# Altium footprint library Connectors.PcbLib: 66 footprints (part 4 of 5)
Each footprint in its own frame and in the unit in brackets; x right, y up, seen from the top. Pads: shape width x height; smd on the part's side, far side on the other; paste and mask are expansions set on the pad; w line width, h text height; cw(c..) or ccw(c..) is an arc to the next point about the centre after c.
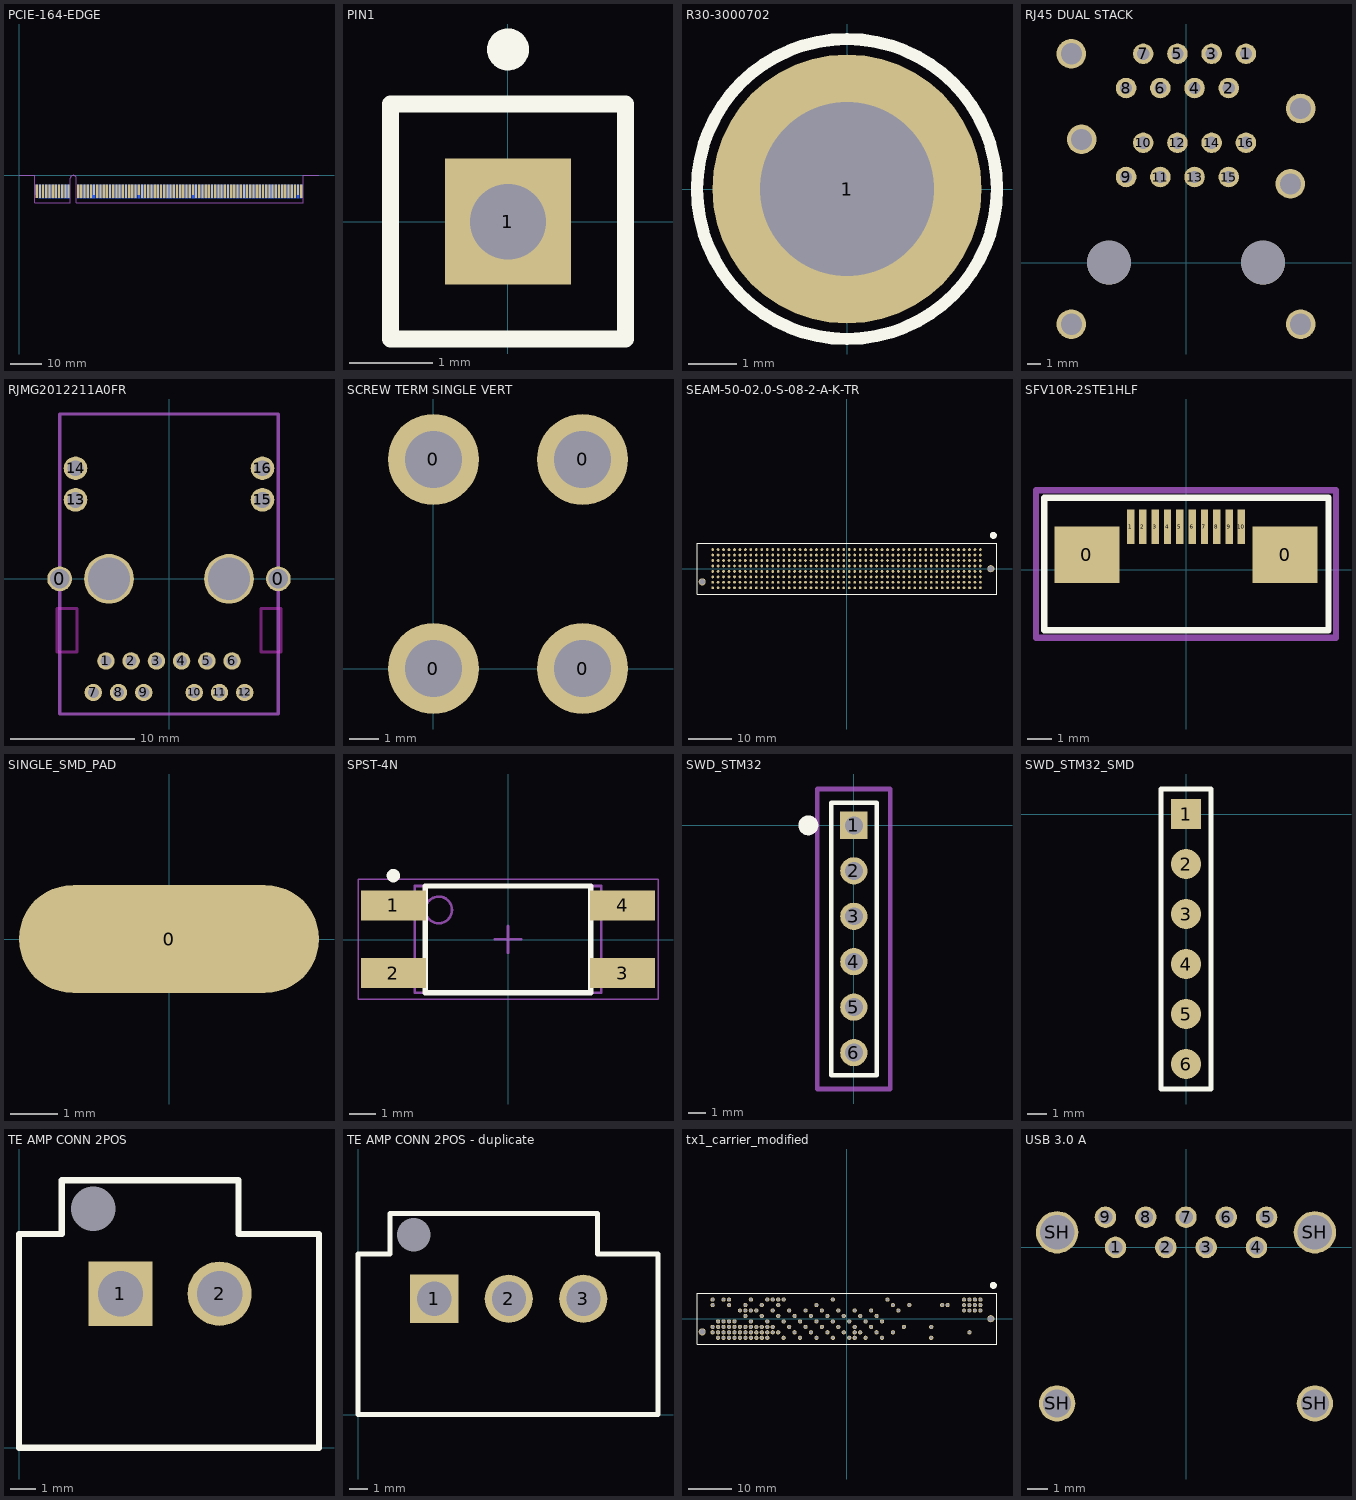
[diagram p3: the footprints below, top view; thin cyan lines are the x and y axes]

## PCIE-164-EDGE [mm] "PCIe x16 Edge Connector Pads, 164 position"
pads (164):
  rect 0.7x3.2 smd far side mask+0.102: 1(5.55,-4.5)
  rect 0.7x4.2 smd far side: 2(6.55,-5) 3(7.55,-5) 4(8.55,-5) 5(9.55,-5) 6(10.55,-5) 7(11.55,-5) 8(12.55,-5) 9(13.55,-5) 10(14.55,-5) 11(15.55,-5) 12(18.55,-5) 13(19.55,-5) 14(20.55,-5) 15(21.55,-5) 16(22.55,-5) 17(23.55,-5) 18(24.55,-5) 19(25.55,-5) 20(26.55,-5) 21(27.55,-5) 22(28.55,-5) 23(29.55,-5) 24(30.55,-5) 25(31.55,-5) 26(32.55,-5) 27(33.55,-5) 28(34.55,-5) 29(35.55,-5) 30(36.55,-5) 31(37.55,-5) 32(38.55,-5) 33(39.55,-5) 34(40.55,-5) 35(41.55,-5) 36(42.55,-5) 37(43.55,-5) 38(44.55,-5) 39(45.55,-5) 40(46.55,-5) 41(47.55,-5) 42(48.55,-5) 43(49.55,-5) 44(50.55,-5) 45(51.55,-5) 46(52.55,-5) 47(53.55,-5) 48(54.55,-5) 49(55.55,-5) 50(56.55,-5) 51(57.55,-5) 52(58.55,-5) 53(59.55,-5) 54(60.55,-5) 55(61.55,-5) 56(62.55,-5) 57(63.55,-5) 58(64.55,-5) 59(65.55,-5) 60(66.55,-5) 61(67.55,-5) 62(68.55,-5) 63(69.55,-5) 64(70.55,-5) 65(71.55,-5) 66(72.55,-5) 67(73.55,-5) 68(74.55,-5) 69(75.55,-5) 70(76.55,-5) 71(77.55,-5) 72(78.55,-5) 73(79.55,-5) 74(80.55,-5) 75(81.55,-5) 76(82.55,-5) 77(83.55,-5) 78(84.55,-5) 79(85.55,-5) 80(86.55,-5) 81(87.55,-5) 82(88.55,-5)
  rect 0.7x4.2 smd: 83(5.55,-5) 84(6.55,-5) 85(7.55,-5) 86(8.55,-5) 87(9.55,-5) 88(10.55,-5) 89(11.55,-5) 90(12.55,-5) 91(13.55,-5) 92(14.55,-5) 93(15.55,-5) 94(18.55,-5) 95(19.55,-5) 96(20.55,-5) 97(21.55,-5) 98(22.55,-5) 100(24.55,-5) 101(25.55,-5) 102(26.55,-5) 103(27.55,-5) 104(28.55,-5) 105(29.55,-5) 106(30.55,-5) 107(31.55,-5) 108(32.55,-5) 109(33.55,-5) 110(34.55,-5) 111(35.55,-5) 112(36.55,-5) 114(38.55,-5) 115(39.55,-5) 116(40.55,-5) 117(41.55,-5) 118(42.55,-5) 119(43.55,-5) 120(44.55,-5) 121(45.55,-5) 122(46.55,-5) 123(47.55,-5) 124(48.55,-5) 125(49.55,-5) 126(50.55,-5) 127(51.55,-5) 128(52.55,-5) 129(53.55,-5) 131(55.55,-5) 132(56.55,-5) 133(57.55,-5) 134(58.55,-5) 135(59.55,-5) 136(60.55,-5) 137(61.55,-5) 138(62.55,-5) 139(63.55,-5) 140(64.55,-5) 141(65.55,-5) 142(66.55,-5) 143(67.55,-5) 144(68.55,-5) 145(69.55,-5) 146(70.55,-5) 147(71.55,-5) 148(72.55,-5) 149(73.55,-5) 150(74.55,-5) 151(75.55,-5) 152(76.55,-5) 153(77.55,-5) 154(78.55,-5) 155(79.55,-5) 156(80.55,-5) 157(81.55,-5) 158(82.55,-5) 159(83.55,-5) 160(84.55,-5) 161(85.55,-5) 162(86.55,-5) 164(88.55,-5)
  rect 0.7x3.2 smd mask+0.102: 99(23.55,-4.5) 113(37.55,-4.5) 130(54.55,-4.5) 163(87.55,-4.5)
Mechanical 1:
  lines w0.1: 0,0 5,0 5,-8.5 16.1,-8.5 16.1,-0.95 cw(c17.05,-0.95) 18,-0.95 18,-8.5 89.1,-8.5 89.1,0 94.1,0

## PIN1 [mm] "Connector; Plug"
pads (1):
  rect 1.5x1.5 hole 0.9: 1(0,0)
Top Overlay:
  circle w0.25: c0,2.05 r0.125
  lines w0.2: -1.4,-1.4 1.4,-1.4 1.4,1.4 -1.4,1.4 -1.4,-1.4

## R30-3000702 [mil] "HEX STANDOFF M3 BRASS 7MM"
height 275.59
pads (1):
  round 220 hole 141.7: 1(0,0)
Top Overlay:
  circle w10: c0,0 r122.49

## RJ45 DUAL STACK [mm] "RJ45, 8p8c, 2 port, double stacked connector"
height 25.27
pads (24):
  round 1.524 hole 0.9: 1(4.445,15.49) 2(3.175,12.95) 3(1.905,15.49) 4(0.635,12.95) 5(-0.635,15.49) 6(-1.905,12.95) 7(-3.175,15.49) 8(-4.445,12.95) 10(-3.175,8.89) 11(-1.905,6.35) 12(-0.635,8.89) 13(0.635,6.35) 14(1.905,8.89) 15(3.175,6.35) 16(4.445,8.89)
  round 1.524 hole 0.9 mask+0.102: 9(-4.445,6.35)
  round 2.194 hole 1.57 unplated: ""(-8.505,-4.57) ""(-8.505,15.49) ""(-7.745,9.14) ""(7.745,5.84) ""(8.505,-4.57) ""(8.505,11.43)
  round 3.25 hole 3.25 unplated: ""(-5.715,0) ""(5.715,0)
3D body "c-5569381-1-c1-3d.stp": height 25.29, standoff -4.18, extent -9.652,-10.77 9.652,17.678

## RJMG2012211A0FR [mm] "1 Port RJ45 Magjack Connector Board Edge, Through Hole 10/100/1000 Base-T, AutoMDIX"
height 11.3
pads (20):
  round 2 hole 1.57: 0(-8.79,0) 0(8.79,0)
  round 1.4 hole 0.89: 1(-5.075,-6.6) 2(-3.045,-6.6) 3(-1.015,-6.6) 4(1.015,-6.6) 5(3.045,-6.6) 6(5.075,-6.6) 7(-6.09,-9.14) 8(-4.06,-9.14) 9(-2.03,-9.14) 10(2.03,-9.14) 11(4.06,-9.14) 12(6.09,-9.14)
  round 1.894 hole 1.27: 13(-7.52,6.35) 14(-7.52,8.89) 15(7.52,6.35) 16(7.52,8.89)
  round 4 hole 3.4: ""(-4.825,0) ""(4.825,0)
Keep-Out Layer:
  lines w0.254: -9,-5.89 -7.4,-5.89 -7.4,-2.39 -9,-2.39 -9,-5.89 ; 7.4,-5.89 7.4,-2.39 9,-2.39 9,-5.89 7.4,-5.89
Mechanical 15:
  lines w0.254: -8.79,-10.87 -8.79,13.26 8.79,13.26 8.79,-10.87 -8.79,-10.87

## SCREW TERM SINGLE VERT [mil] "Keystone Electronics 7701 - TERM W/ASSEMBLD SCREW VERT PCMNT"
height 243
pads (4):
  round 120 hole 75: 0(0,0) 0(0,276) 0(197,0) 0(197,276)
3D body "keystone-PN7701.step": height 321.92, standoff -192.49, extent -53.39,-13.97 256.61,296.03

## SEAM-50-02.0-S-08-2-A-K-TR [mil] "TX 1 carrier board connector"
height 4.6
pads (402):
  round 25 smd: A1(1225,175) A2(1175,175) A3(1125,175) A4(1075,175) A5(1025,175) A6(975,175) A7(925,175) A8(875,175) A9(825,175) A10(775,175) A11(725,175) A12(675,175) A13(625,175) A14(575,175) A15(525,175) A16(475,175) A17(425,175) A18(375,175) A19(325,175) A20(275,175) A21(225,175) A22(175,175) A23(125,175) A24(75,175) A25(25,175) A26(-25,175) A27(-75,175) A28(-125,175) A29(-175,175) A30(-225,175) A31(-275,175) A32(-325,175) A33(-375,175) A34(-425,175) A35(-475,175) A36(-525,175) A37(-575,175) A38(-625,175) A39(-675,175) A40(-725,175) A41(-775,175) A42(-825,175) A43(-875,175) A44(-925,175) A45(-975,175) A46(-1025,175) A47(-1075,175) A48(-1125,175) A49(-1175,175) A50(-1225,175) B1(1225,125) B2(1175,125) B3(1125,125) B4(1075,125) B5(1025,125) B6(975,125) B7(925,125) B8(875,125) B9(825,125) B10(775,125) B11(725,125) B12(675,125) B13(625,125) B14(575,125) B15(525,125) B16(475,125) B17(425,125) B18(375,125) B19(325,125) B20(275,125) B21(225,125) B22(175,125) B23(125,125) B24(75,125) B25(25,125) B26(-25,125) B27(-75,125) B28(-125,125) B29(-175,125) B30(-225,125) B31(-275,125) B32(-325,125) B33(-375,125) B34(-425,125) B35(-475,125) B36(-525,125) B37(-575,125) B38(-625,125) B39(-675,125) B40(-725,125) B41(-775,125) B42(-825,125) B43(-875,125) B44(-925,125) B45(-975,125) B46(-1025,125) B47(-1075,125) B48(-1125,125) B49(-1175,125) B50(-1225,125) C1(1225,75) C2(1175,75) C3(1125,75) C4(1075,75) C5(1025,75) C6(975,75) C7(925,75) C8(875,75) C9(825,75) C10(775,75) C11(725,75) C12(675,75) C13(625,75) C14(575,75) C15(525,75) C16(475,75) C17(425,75) C18(375,75) C19(325,75) C20(275,75) C21(225,75) C22(175,75) C23(125,75) C24(75,75) C25(25,75) C26(-25,75) C27(-75,75) C28(-125,75) C29(-175,75) C30(-225,75) C31(-275,75) C32(-325,75) C33(-375,75) C34(-425,75) C35(-475,75) C36(-525,75) C37(-575,75) C38(-625,75) C39(-675,75) C40(-725,75) C41(-775,75) C42(-825,75) C43(-875,75) C44(-925,75) C45(-975,75) C46(-1025,75) C47(-1075,75) C48(-1125,75) C49(-1175,75) C50(-1225,75) D1(1225,25) D2(1175,25) D3(1125,25) D4(1075,25) D5(1025,25) D6(975,25) D7(925,25) D8(875,25) D9(825,25) D10(775,25) D11(725,25) D12(675,25) D13(625,25) D14(575,25) D15(525,25) D16(475,25) D17(425,25) D18(375,25) D19(325,25) D20(275,25) D21(225,25) D22(175,25) D23(125,25) D24(75,25) D25(25,25) D26(-25,25) D27(-75,25) D28(-125,25) D29(-175,25) D30(-225,25) D31(-275,25) D32(-325,25) D33(-375,25) D34(-425,25) D35(-475,25) D36(-525,25) D37(-575,25) D38(-625,25) D39(-675,25) D40(-725,25) D41(-775,25) D42(-825,25) D43(-875,25) D44(-925,25) D45(-975,25) D46(-1025,25) D47(-1075,25) D48(-1125,25) D49(-1175,25) D50(-1225,25) E1(1225,-25) E2(1175,-25) E3(1125,-25) E4(1075,-25) E5(1025,-25) E6(975,-25) E7(925,-25) E8(875,-25) E9(825,-25) E10(775,-25) E11(725,-25) E12(675,-25) E13(625,-25) E14(575,-25) E15(525,-25) E16(475,-25) E17(425,-25) E18(375,-25) E19(325,-25) E20(275,-25) E21(225,-25) E22(175,-25) E23(125,-25) E24(75,-25) E25(25,-25) E26(-25,-25) E27(-75,-25) E28(-125,-25) E29(-175,-25) E30(-225,-25) E31(-275,-25) E32(-325,-25) E33(-375,-25) E34(-425,-25) E35(-475,-25) E36(-525,-25) E37(-575,-25) E38(-625,-25) E39(-675,-25) E40(-725,-25) E41(-775,-25) E42(-825,-25) E43(-875,-25) E44(-925,-25) E45(-975,-25) E46(-1025,-25) E47(-1075,-25) E48(-1125,-25) E49(-1175,-25) E50(-1225,-25) F1(1225,-75) F2(1175,-75) F3(1125,-75) F4(1075,-75) F5(1025,-75) F6(975,-75) F7(925,-75) F8(875,-75) F9(825,-75) F10(775,-75) F11(725,-75) F12(675,-75) F13(625,-75) F14(575,-75) F15(525,-75) F16(475,-75) F17(425,-75) F18(375,-75) F19(325,-75) F20(275,-75) F21(225,-75) F22(175,-75) F23(125,-75) F24(75,-75) F25(25,-75) F26(-25,-75) F27(-75,-75) F28(-125,-75) F29(-175,-75) F30(-225,-75) F31(-275,-75) F32(-325,-75) F33(-375,-75) F34(-425,-75) F35(-475,-75) F36(-525,-75) F37(-575,-75) F38(-625,-75) F39(-675,-75) F40(-725,-75) F41(-775,-75) F42(-825,-75) F43(-875,-75) F44(-925,-75) F45(-975,-75) F46(-1025,-75) F47(-1075,-75) F48(-1125,-75) F49(-1175,-75) F50(-1225,-75) G1(1225,-125) G2(1175,-125) G3(1125,-125) G4(1075,-125) G5(1025,-125) G6(975,-125) G7(925,-125) G8(875,-125) G9(825,-125) G10(775,-125) G11(725,-125) G12(675,-125) G13(625,-125) G14(575,-125) G15(525,-125) G16(475,-125) G17(425,-125) G18(375,-125) G19(325,-125) G20(275,-125) G21(225,-125) G22(175,-125) G23(125,-125) G24(75,-125) G25(25,-125) G26(-25,-125) G27(-75,-125) G28(-125,-125) G29(-175,-125) G30(-225,-125) G31(-275,-125) G32(-325,-125) G33(-375,-125) G34(-425,-125) G35(-475,-125) G36(-525,-125) G37(-575,-125) G38(-625,-125) G39(-675,-125) G40(-725,-125) G41(-775,-125) G42(-825,-125) G43(-875,-125) G44(-925,-125) G45(-975,-125) G46(-1025,-125) G47(-1075,-125) G48(-1125,-125) G49(-1175,-125) G50(-1225,-125) H1(1225,-175) H2(1175,-175) H3(1125,-175) H4(1075,-175) H5(1025,-175) H6(975,-175) H7(925,-175) H8(875,-175) H9(825,-175) H10(775,-175) H11(725,-175) H12(675,-175) H13(625,-175) H14(575,-175) H15(525,-175) H16(475,-175) H17(425,-175) H18(375,-175) H19(325,-175) H20(275,-175) H21(225,-175) H22(175,-175) H23(125,-175) H24(75,-175) H25(25,-175) H26(-25,-175) H27(-75,-175) H28(-125,-175) H29(-175,-175) H30(-225,-175) H31(-275,-175) H32(-325,-175) H33(-375,-175) H34(-425,-175) H35(-475,-175) H36(-525,-175) H37(-575,-175) H38(-625,-175) H39(-675,-175) H40(-725,-175) H41(-775,-175) H42(-825,-175) H43(-875,-175) H44(-925,-175) H45(-975,-175) H46(-1025,-175) H47(-1075,-175) H48(-1125,-175) H49(-1175,-175) H50(-1225,-175)
  round 65 hole 50: ""(-1320.5,-120) ""(1320.5,0)
Top Overlay:
  circle w32: c1344,305 r16.03
  lines w10: 1377,231 1377,-235 -1368,-235 -1368,233 1377,233
3D body "SEAM-50-02.0-S-08-2-A-K-TR.stp": height 218, standoff -53, extent -1348.5,-239.99 1382.5,238

## SFV10R-2STE1HLF [mm] "CONN FFC TOP 10POS 0.50MM R/A"
height 1.8
pads (12):
  rect 2.65x2.3 smd: 0(-4.025,0.6) 0(4.025,0.6)
  rect 0.3x1.4 smd: 1(-2.25,1.75) 2(-1.75,1.75) 3(-1.25,1.75) 4(-0.75,1.75) 5(-0.25,1.75) 6(0.25,1.75) 7(0.75,1.75) 8(1.25,1.75) 9(1.75,1.75) 10(2.25,1.75)
Top Overlay:
  lines w0.254: -5.766,-2.464 -5.766,2.921 5.791,2.921 5.791,-2.464 -5.766,-2.464
Mechanical 15:
  lines w0.254: -6.096,-2.769 -6.096,3.226 6.096,3.226 6.096,-2.769 -6.096,-2.769
3D body: height 0.25, standoff 0, extent -0.533,-0.864 -0.533,-0.864

## SINGLE_SMD_PAD [mil]
pads (1):
  oval 250x90 smd: 0(0,0)

## SPST-4N [mm] "For SPST-4DIP"
pads (4):
  rect 2.44x1.13 smd: 1(-4.3,1.295) 2(-4.3,-1.245) 3(4.3,-1.245) 4(4.3,1.295)
Top Overlay:
  circle w0.25: c-4.3,2.41 r0.125
  lines w0.2: -3.1,-1.975 3.1,-1.975 3.1,2.025 -3.1,2.025 -3.1,-1.975
Mechanical 13:
  circle w0.1: c-2.6,1.125 r0.5
  lines w0.1: -3.5,-1.975 3.5,-1.975 3.5,2.025 -3.5,2.025 -3.5,-1.975
Mechanical 15:
  lines w0.05: -5.625,-2.225 5.625,-2.225 5.625,2.275 -5.625,2.275 -5.625,-2.225
  lines w0.1: -0.5,0.025 0.5,0.025 ; 0,-0.475 0,0.525
3D body: height 3.8, standoff 0.55, extent -3.5,-1.975 3.5,2.025

## SWD_STM32 [mil] "SWD connector matching the pinout on STM Discovery Boards"
pads (6):
  rect 60x60 hole 39.37: 1(0,0)
  round 60 hole 39.37: 2(0,-100) 3(0,-200) 4(0,-300) 5(0,-400) 6(0,-500)
Top Overlay:
  circle w23.62: c-100,0 r10
  lines w10: -50,-550 50,-550 50,50 -50,50 -50,-550
Mechanical 15:
  lines w10: -80,-580 80,-580 80,80 -80,80 -80,-580

## SWD_STM32_SMD [mil] "SWD connector matching the pinout on STM Discovery Boards"
pads (6):
  rect 60x60 smd: 1(0,0)
  round 60 smd: 2(0,-100) 3(0,-200) 4(0,-300) 5(0,-400) 6(0,-500)
Top Overlay:
  lines w10: -50,-550 -50,50 50,50 50,-550 -50,-550

## TE AMP CONN 2POS [mm] "CONN HEADER 2POS STR .156 TIN"
height 12
pads (3):
  round 0 hole 1.78: 0(2.97,9.55)
  rect 2.562x2.562 hole 1.81: 1(4.05,6.15)
  round 2.562 hole 1.81: 2(8.01,6.15)
Top Overlay:
  lines w0.254: 0,0 0,8.534 1.702,8.534 1.702,10.681 8.763,10.681 8.763,8.534 11.976,8.534 11.976,0 0,0
3D body "c-1877285-2-c-3d.stp": height 12, standoff -3.62, extent 0.428,0.357 11.598,10.247

## TE AMP CONN 2POS - duplicate [mm] "CONN HEADER 3POS STR .156 TIN"
height 12
pads (4):
  rect 2.562x2.562 hole 1.81: 1(4.05,6.15)
  round 2.562 hole 1.81: 2(8.01,6.15) 3(11.97,6.15)
  round 0 hole 1.78: ""(2.97,9.55)
Top Overlay:
  lines w0.254: 0,0 15.936,0 15.936,8.534 12.723,8.534 12.723,10.681 1.702,10.681 1.702,8.534 0,8.534 0,0
3D body "c-1877285-3-c-3d.stp": height 12, standoff -3.62, extent 0.432,0.356 15.562,10.246

## tx1_carrier_modified [mil] "TX 1 carrier board connector modified to remove pads"
height 4.6
pads (129):
  round 39 hole 25: A1(1225,175) A2(1175,175) A3(1125,175) A4(1075,175) A18(375,175) A28(-125,175) A37(-575,175) A38(-625,175) A39(-675,175) A40(-725,175) A43(-875,175) A47(-1075,175) A48(-1125,175) A50(-1225,175) B1(1225,125) B2(1175,125) B3(1125,125) B4(1075,125) B7(925,125) B8(875,125) B14(575,125) B17(425,125) B31(-275,125) B38(-625,125) B41(-775,125) B44(-925,125) B47(-1075,125) B50(-1225,125) C1(1225,75) C2(1175,75) C3(1125,75) C4(1075,75) C16(475,75) C21(225,75) C24(75,75) C27(-75,75) C30(-225,75) C33(-375,75) C36(-525,75) C39(-675,75) C42(-825,75) C43(-875,75) C44(-925,75) C45(-975,75) D20(275,25) D23(125,25) D26(-25,25) D29(-175,25) D32(-325,25) D35(-475,25) D38(-625,25) D41(-775,25) D44(-925,25) E19(325,-25) E22(175,-25) E25(25,-25) E28(-125,-25) E31(-275,-25) E34(-425,-25) E37(-575,-25) E40(-725,-25) E43(-875,-25) E46(-1025,-25) E47(-1075,-25) E48(-1125,-25) E49(-1175,-25) F10(775,-75) F15(525,-75) F21(225,-75) F24(75,-75) F27(-75,-75) F30(-225,-75) F33(-375,-75) F36(-525,-75) F39(-675,-75) F40(-725,-75) F41(-775,-75) F42(-825,-75) F43(-875,-75) F44(-925,-75) F45(-975,-75) F46(-1025,-75) F47(-1075,-75) F48(-1125,-75) F49(-1175,-75) F50(-1225,-75) G3(1125,-125) G17(425,-125) G20(275,-125) G23(125,-125) G24(75,-125) G26(-25,-125) G29(-175,-125) G32(-325,-125) G35(-475,-125) G38(-625,-125) G39(-675,-125) G40(-725,-125) G41(-775,-125) G42(-825,-125) G43(-875,-125) G44(-925,-125) G45(-975,-125) G46(-1025,-125) G47(-1075,-125) G48(-1125,-125) G49(-1175,-125) G50(-1225,-125) H10(775,-175) H19(325,-175) H22(175,-175) H24(75,-175) H25(25,-175) H28(-125,-175) H31(-275,-175) H34(-425,-175) H37(-575,-175) H40(-725,-175) H41(-775,-175) H42(-825,-175) H43(-875,-175) H44(-925,-175) H45(-975,-175) H46(-1025,-175) H47(-1075,-175) H48(-1125,-175) H49(-1175,-175)
  round 65 hole 50: ""(-1320.5,-120) ""(1320.5,0)
Top Overlay:
  circle w32: c1344,305 r16.03
  lines w10: 1377,231 1377,-235 -1368,-235 -1368,233 1377,233
3D body "SEAM-50-02.0-S-08-2-A-K-TR.stp": height 218, standoff -53, extent -1348.5,-239.99 1382.5,238

## USB 3.0 A [mm] "0483930003"
height 6.86
pads (13):
  round 1.067 hole 0.7: 1(-3.5,0) 2(-1,0) 3(1,0) 4(3.5,0) 5(4,1.5) 6(2,1.5) 7(0,1.5) 8(-2,1.5) 9(-4,1.5)
  round 1.8 hole 1.4: SH(-6.4,-7.75) SH(6.4,-7.75)
  round 2.1 hole 1.7: SH(-6.4,0.75) SH(6.4,0.75)
3D body "483930003.stp": height 7, standoff -1.04, extent -6.9,-11.725 6.9,2.525